# Altium footprint library AMA4B_adapter_board.PcbLib: 73 footprints (part 2 of 5)
Each footprint in its own frame and in the unit in brackets; x right, y up, seen from the top. Pads: shape width x height; smd on the part's side, far side on the other; paste and mask are expansions set on the pad; w line width, h text height; cw(c..) or ccw(c..) is an arc to the next point about the centre after c.
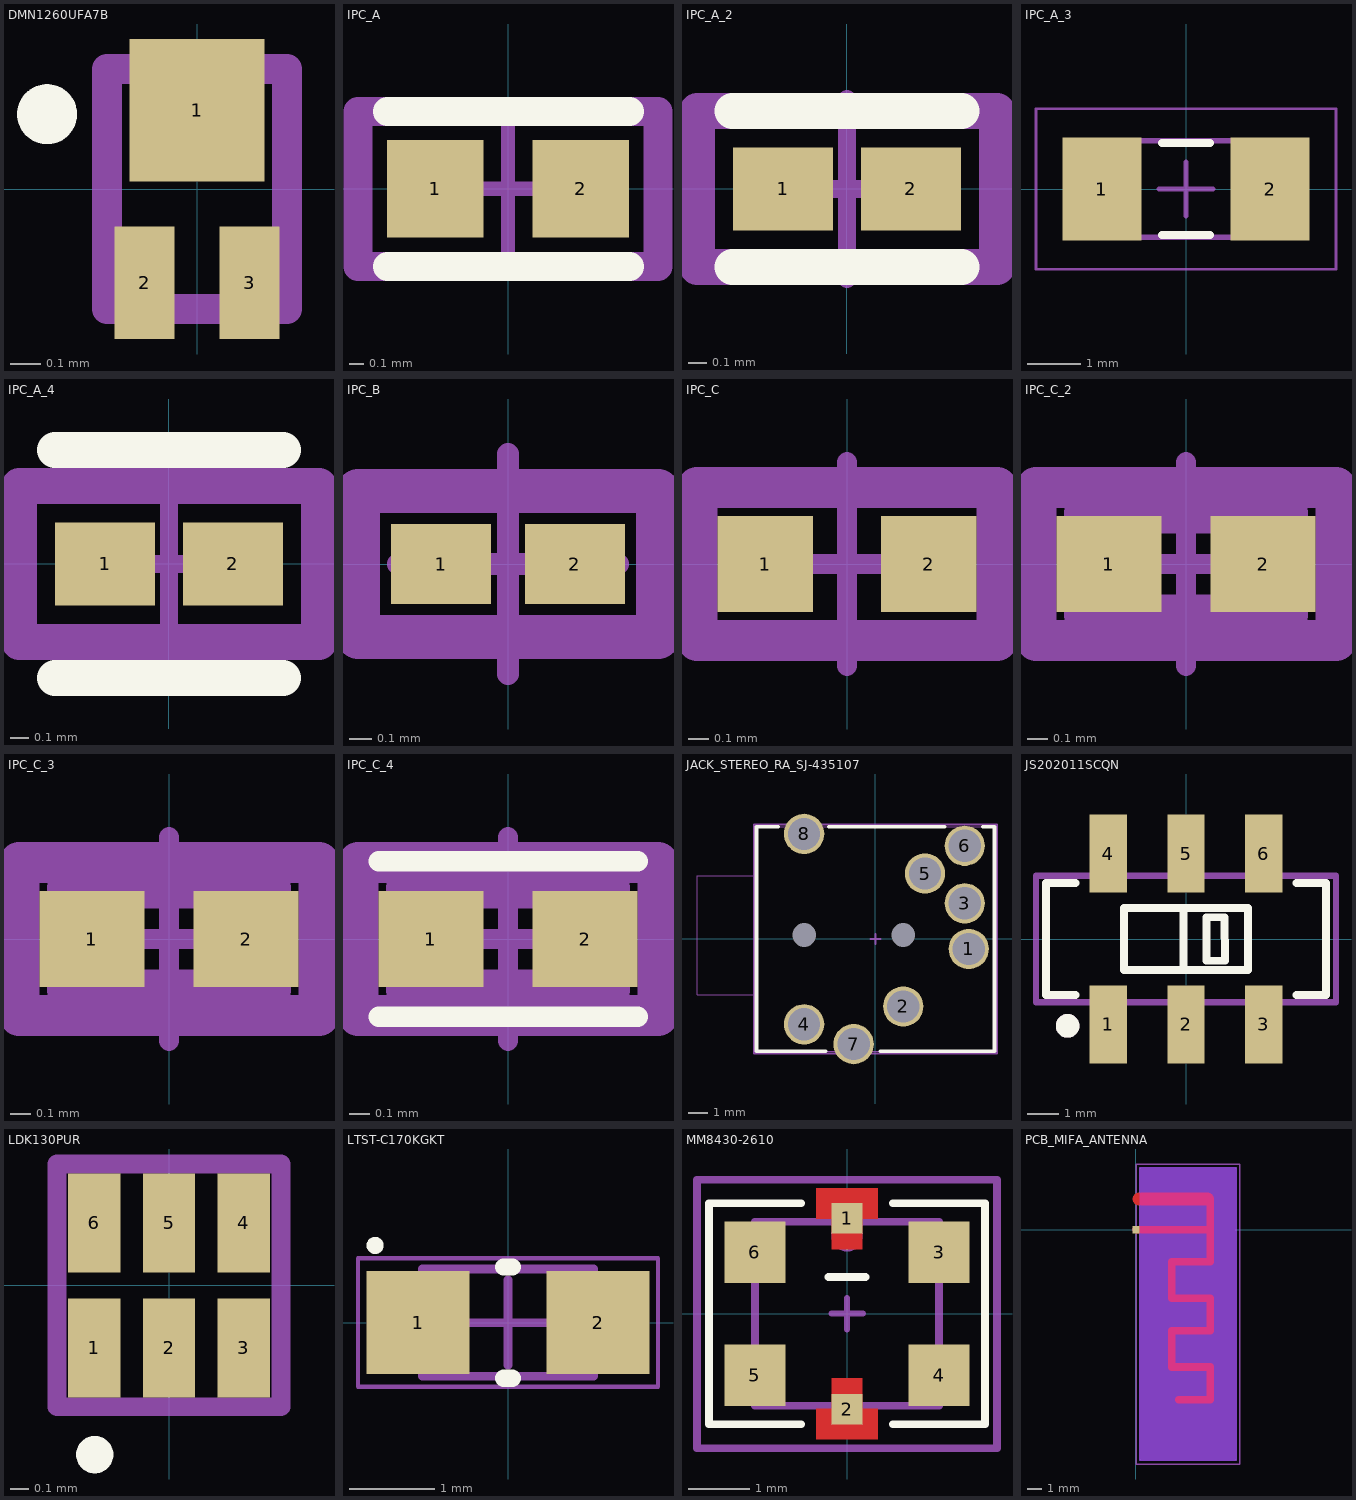
[diagram p1: the footprints below, top view; thin cyan lines are the x and y axes]

## DMN1260UFA7B [mm]
pads (3):
  rect 0.45x0.475 smd: 1(0,0.263)
  rect 0.2x0.375 smd: 2(-0.175,-0.312) 3(0.175,-0.312)
Top Overlay:
  lines w0.1: -0.5,0.2 ccw(c-0.5,0.25) -0.5,0.3 ccw(c-0.5,0.25) -0.5,0.2
Top Assembly:
  lines w0.1: -0.3,-0.4 0.3,-0.4 0.3,0.4 -0.3,0.4 -0.3,-0.4
  text ".Designator" at -0.674,-0.068 h0.3
3D body "DMN1260UFA-7B.stp": height 0.35, standoff -0.01, extent -0.325,-0.431 0.325,0.425

## IPC_A [mm]
pads (2):
  rect 0.668x0.672 smd mask+0.051: 1(-0.502,0) 2(0.502,0)
Top Overlay:
  lines w0.2: -0.834,-0.537 0.839,-0.537 ; -0.834,0.536 0.839,0.536
Top Assembly:
  lines w0.2: -1.036,-0.536 1.036,-0.536 1.036,0.536 -1.036,0.536 -1.036,-0.536
  text ".Designator" at -1.126,-0.113 h0.5
Top Courtyard:
  lines w0.2: -1.036,-0.536 1.036,-0.536 1.036,0.536 -1.036,0.536 -1.036,-0.536
Top Component Center:
  lines w0.1: -0.5,0 0.5,0 ; 0,-0.5 0,0.5
3D body: height 0.4, standoff 0, extent 0.275,-0.275 0.525,0.275
3D body: height 0.4, standoff 0, extent -0.525,-0.275 -0.275,0.275
3D body: height 0.4, standoff 0, extent -0.275,-0.275 0.275,0.275

## IPC_A_2 [mm]
pads (2):
  rect 0.554x0.463 smd mask+0.025: 1(-0.354,0) 2(0.354,0)
Top Overlay:
  lines w0.2: -0.635,-0.432 0.635,-0.432 ; -0.635,0.432 0.635,0.432
Board Shape:
  lines w0.2: -0.831,-0.431 -0.831,0.431 0.831,0.431 0.831,-0.431 -0.831,-0.431
  text ".Designator" at 2.152,-0.874 h1
Top Courtyard:
  lines w0.2: -0.831,-0.431 -0.831,0.431 0.831,0.431 0.831,-0.431 -0.831,-0.431
Top Component Center:
  lines w0.1: -0.5,0 0.5,0 ; 0,-0.5 0,0.5
3D body: height 0.33, standoff 0, extent -0.165,-0.165 0.165,0.165
3D body: height 0.33, standoff 0, extent -0.315,-0.165 -0.165,0.165
3D body: height 0.33, standoff 0, extent 0.165,-0.165 0.315,0.165

## IPC_A_3 [mm]
pads (2):
  rect 1.47x1.92 smd: 1(-1.57,0) 2(1.57,0)
Top Overlay:
  lines w0.152: -0.45,-0.86 0.45,-0.86 ; -0.45,0.86 0.45,0.86
Board Shape:
  lines w0.1: -1.75,-0.9 1.75,-0.9 1.75,0.9 -1.75,0.9 -1.75,-0.9
  text ".Designator" at -1.145,-0.115 h0.51
Top Courtyard:
  lines w0.05: -2.8,-1.5 2.8,-1.5 2.8,1.5 -2.8,1.5 -2.8,-1.5
Top Component Center:
  lines w0.1: -0.5,0 0.5,0 ; 0,-0.5 0,0.5
3D body "INDC3216X11M.step": height 1.1, standoff 0, extent -1.75,-0.9 1.75,0.9

## IPC_A_4 [mm]
pads (2):
  rect 0.554x0.463 smd mask+0.025: 1(-0.354,0) 2(0.354,0)
Top Overlay:
  lines w0.2: -0.631,-0.631 0.631,-0.631 ; -0.631,0.631 0.631,0.631
Board Shape:
  lines w0.2: -0.831,-0.431 0.831,-0.431 0.831,0.431 -0.831,0.431 -0.831,-0.431
  text ".Designator" at -0.713,0.975 h1
Top Courtyard:
  lines w0.2: -0.831,-0.431 0.831,-0.431 0.831,0.431 -0.831,0.431 -0.831,-0.431
Top Component Center:
  lines w0.1: -0.5,0 0.5,0 ; 0,-0.5 0,0.5
3D body: height 0.33, standoff 0, extent 0.165,-0.165 0.315,0.165
3D body: height 0.33, standoff 0, extent -0.315,-0.165 -0.165,0.165
3D body: height 0.33, standoff 0, extent -0.165,-0.165 0.165,0.165

## IPC_B [mm]
pads (2):
  rect 0.454x0.363 smd mask+0.025: 1(-0.304,0) 2(0.304,0)
Board Shape:
  lines w0.2: -0.681,-0.331 -0.681,0.331 0.681,0.331 0.681,-0.331 -0.681,-0.331
  text ".Designator" at 2.015,-0.698 h1
Top Courtyard:
  lines w0.2: -0.681,-0.331 -0.681,0.331 0.681,0.331 0.681,-0.331 -0.681,-0.331
Top Component Center:
  lines w0.1: -0.5,0 0.5,0 ; 0,-0.5 0,0.5
3D body: height 0.33, standoff 0, extent -0.165,-0.165 0.165,0.165
3D body: height 0.33, standoff 0, extent -0.315,-0.165 -0.165,0.165
3D body: height 0.33, standoff 0, extent 0.165,-0.165 0.315,0.165

## IPC_C [mm]
pads (2):
  rect 0.468x0.472 smd mask+0.051: 1(-0.402,0) 2(0.402,0)
Board Shape:
  lines w0.2: -0.736,-0.375 -0.736,0.375 0.736,0.375 0.736,-0.375 -0.736,-0.375
  text ".Designator" at -0.686,-1.159 h1
Top Courtyard:
  lines w0.2: -0.736,-0.375 -0.736,0.375 0.736,0.375 0.736,-0.375 -0.736,-0.375
Top Component Center:
  lines w0.1: -0.5,0 0.5,0 ; 0,-0.5 0,0.5
3D body: height 0.4, standoff 0, extent -0.275,-0.275 0.275,0.275
3D body: height 0.4, standoff 0, extent -0.525,-0.275 -0.275,0.275
3D body: height 0.4, standoff 0, extent 0.275,-0.275 0.525,0.275

## IPC_C_2 [mm]
pads (2):
  rect 0.515x0.472 smd mask+0.051: 1(-0.379,0) 2(0.379,0)
Board Shape:
  lines w0.2: -0.736,-0.375 -0.736,0.375 0.736,0.375 0.736,-0.375 -0.736,-0.375
  text ".Designator" at -2.227,-1.293 h1
Top 3D Body:
  lines w0.2: -0.5,-0.25 -0.5,0.25 0.5,0.25 0.5,-0.25 -0.5,-0.25
Top Courtyard:
  lines w0.2: -0.736,-0.375 -0.736,0.375 0.736,0.375 0.736,-0.375 -0.736,-0.375
Top Component Center:
  lines w0.1: -0.5,0 0.5,0 -0.5,0 ; 0,-0.5 0,0.5 0,-0.5
3D body "Cap_Samsung_CL05A105MP5NNNC_eec.STEP": height 0.55, standoff 0, extent -0.5,-0.25 0.5,0.25

## IPC_C_3 [mm]
pads (2):
  rect 0.515x0.472 smd mask+0.051: 1(-0.379,0) 2(0.379,0)
Board Shape:
  lines w0.2: -0.736,-0.375 0.736,-0.375 0.736,0.375 -0.736,0.375 -0.736,-0.375
  text ".Designator" at -0.558,-0.253 h1
Top 3D Body:
  lines w0.2: -0.5,-0.25 0.5,-0.25 0.5,0.25 -0.5,0.25 -0.5,-0.25
Top Courtyard:
  lines w0.2: -0.736,-0.375 0.736,-0.375 0.736,0.375 -0.736,0.375 -0.736,-0.375
Top Component Center:
  lines w0.1: -0.5,0 0.5,0 -0.5,0 ; 0,-0.5 0,0.5 0,-0.5
3D body "Cap_Samsung_CL05A105MP5NNNC_eec.STEP": height 0.55, standoff 0, extent -0.5,-0.25 0.5,0.25

## IPC_C_4 [mm]
pads (2):
  rect 0.515x0.472 smd paste+0 mask+0.05: 1(-0.379,0) 2(0.379,0)
Top Overlay:
  lines w0.102: -0.635,-0.381 0.637,-0.381 ; -0.635,0.381 0.637,0.381
Board Shape:
  lines w0.2: -0.736,-0.375 -0.736,0.375 0.736,0.375 0.736,-0.375 -0.736,-0.375
  text ".Designator" at 2.176,1.217 h1
Top 3D Body:
  lines w0.2: -0.5,-0.25 -0.5,0.25 0.5,0.25 0.5,-0.25 -0.5,-0.25
Top Courtyard:
  lines w0.2: -0.736,-0.375 -0.736,0.375 0.736,0.375 0.736,-0.375 -0.736,-0.375
Top Component Center:
  lines w0.1: -0.5,0 0.5,0 ; 0,-0.5 0,0.5
3D body "Ind_Murata_LQG15HN39NJ02D_eec.STEP": height 0.25, standoff 0, extent -0.736,-0.375 0.736,0.375

## JACK_STEREO_RA_SJ-435107 [mil] "JACK_STEREO_RA_SJ-435107"
pads (10):
  round 80 hole 64: 1(185.1,-19.75) 2(55.1,-133.85) 3(177.2,70.85) 4(-141.7,-169.35) 5(98.4,129.85) 6(177.2,185.05) 7(-43.3,-208.65) 8(-141.7,208.65)
  round 10 hole 47 unplated: ""(-141.7,7.85) ""(55.1,7.85)
Top Overlay:
  lines w1: -236.2,-222.45 -236.2,222.45 ; 236.2,-222.45 236.2,222.45
  lines w7.1: -192.9,222.45 -236.2,222.45 -236.2,-222.45 -98.4,-222.45 ; -92.5,222.45 137.8,222.45 ; 9.9,-222.45 236.2,-222.45 236.2,222.45 212.6,222.45
Board Shape:
  lines w1: -236.2,-110.25 -354.3,-110.25 -354.3,125.95 -236.2,125.95 ; -236.2,-222.45 -236.2,222.45 236.2,222.45 236.2,-222.45 -236.2,-222.45
  text ".Designator" at -14.81,-81.28 h40
Top Courtyard:
  lines w4: -241.2,-227.45 -241.2,227.45 241.2,227.45 241.2,-227.45 -241.2,-227.45
Top Component Center:
  lines w4: -10,0 10,0 ; 0,-10 0,10
3D body: height 250, standoff 0, extent -236.2,-222.45 236.2,222.45
3D body: height 248, standoff 12, extent -354.3,-110.15 -236.3,125.85

## JS202011SCQN [mm]
pads (6):
  rect 1.2x2.5 smd: 1(-2.5,-2.75) 2(0,-2.75) 3(2.5,-2.75) 4(-2.5,2.75) 5(0,2.75) 6(2.5,2.75)
Top Overlay:
  circle w0.508: c-3.81,-2.794 r0.127
  lines w0.254: -3.556,-1.8 -4.5,-1.8 -4.5,1.8 -3.556,1.8 ; -0.08,-1 -0.08,1 ; 3.556,-1.8 4.5,-1.8 4.5,1.8 3.556,1.8 ; -2,-1 -2,1 2,1 2,-1 -2,-1 ; 0.66,-0.7 0.66,0.7 1.24,0.7 1.26,-0.7 0.66,-0.7
Board Shape:
  circle w0.508: c-3.81,-2.794 r0.127
  lines w0.203: -0.08,-1 -0.08,1 ; -4.826,-2.032 -4.826,2.032 4.826,2.032 4.826,-2.032 -4.826,-2.032 ; -2,-1 2,-1 2,1 -2,1 -2,-1 ; 0.66,-0.7 0.66,0.7 1.24,0.7 1.26,-0.7 0.66,-0.7
  text ".Designator" at -3.008,-3.409 h1.52
3D body "JS.stp": height 3.6, standoff 0, extent -4.6,-3.5 4.6,3.5

## LDK130PUR [mm]
pads (6):
  rect 0.28x0.53 smd: 1(-0.4,-0.335) 2(0,-0.335) 3(0.4,-0.335) 4(0.4,0.335) 5(0,0.335) 6(-0.4,0.335)
Top Overlay:
  lines w0.1: -0.397,-0.957 ccw(c-0.397,-0.907) -0.397,-0.857 ccw(c-0.397,-0.907) -0.397,-0.957
Top 3D Body:
  lines w0.1: -0.6,-0.65 -0.6,0.65 0.6,0.65 0.6,-0.65 -0.6,-0.65
3D body "LDK130PU-R.stp": height 0.51, standoff 0, extent -0.648,-0.597 0.648,0.597

## LTST-C170KGKT [mm] "SMD, 2-Leads, Body 2.00x1.25mm"
height 1.1
pads (2):
  rect 1.2x1.2 smd: 1(-1.05,0) 2(1.05,0)
Top Overlay:
  circle w0.1: c-1.55,0.9 r0.05
  lines w0.2: -0.05,-0.65 0.05,-0.65 ; -0.05,0.65 0.05,0.65
Board Shape:
  rectangle: -1,-0.625 -0.731,0.625
  lines w0.1: -1,-0.625 -1,0.625 1,0.625 1,-0.625 -1,-0.625
  text ".Designator" at 2.289,0.23 h1.02
Top Courtyard:
  lines w0.05: -1.75,-0.75 1.75,-0.75 1.75,0.75 -1.75,0.75 -1.75,-0.75
Top Component Center:
  lines w0.1: -0.5,0 0.5,0 ; 0,-0.5 0,0.5
3D body: height 1.1, standoff 0.5, extent -0.7,-0.625 0.7,0.625
3D body: height 0.5, standoff 0, extent -1,-0.625 1,0.625

## MM8430-2610 [mm] "MM8430-2610"
pads (6):
  rect 0.498x0.498 smd paste+0 mask+0.102: 1(0,1.557)
  rect 0.5x0.5 smd mask+0.102: 2(0,-1.557)
  rect 1.001x1.001 smd mask+0.05: 3(1.501,1.001) 4(1.501,-1.001) 5(-1.501,-1.001) 6(-1.501,1.001)
Top Layer:
  region: 0.249,-1.049 0.249,-1.549 0.5,-1.549 0.5,-2.05 -0.5,-2.05 -0.5,-1.549 -0.249,-1.549 -0.249,-1.049
  region: 0.249,-1.049 0.249,-1.549 0.5,-1.549 0.5,-2.05 -0.5,-2.05 -0.5,-1.549 -0.249,-1.549 -0.249,-1.049
  region: -0.249,1.049 -0.249,1.549 -0.5,1.549 -0.5,2.05 0.5,2.05 0.5,1.549 0.249,1.549 0.249,1.049
Top Overlay:
  lines w0.127: -0.749,-1.801 -2.25,-1.801 -2.25,1.801 -0.749,1.801 ; -0.3,0.6 0.3,0.6 ; 0.749,-1.801 2.25,-1.801 2.25,1.801 0.749,1.801
Top Paste:
  region: -0.249,1.049 -0.249,1.549 -0.5,1.549 -0.5,2.05 0.5,2.05 0.5,1.549 0.249,1.549 0.249,1.049
  region: -0.249,1.049 -0.249,1.549 -0.5,1.549 -0.5,2.05 0.5,2.05 0.5,1.549 0.249,1.549 0.249,1.049
  region: 0.249,-1.049 0.249,-1.549 0.5,-1.549 0.5,-2.05 -0.5,-2.05 -0.5,-1.549 -0.249,-1.549 -0.249,-1.049
  region: 0.249,-1.049 0.249,-1.549 0.5,-1.549 0.5,-2.05 -0.5,-2.05 -0.5,-1.549 -0.249,-1.549 -0.249,-1.049
Top Solder:
  region: 0.3,-0.998 0.3,-1.499 0.551,-1.499 0.551,-2.098 -0.551,-2.098 -0.551,-1.499 -0.3,-1.499 -0.3,-0.998
  region: -0.3,0.998 -0.3,1.499 -0.551,1.499 -0.551,2.098 0.551,2.098 0.551,1.499 0.3,1.499 0.3,0.998
Board Shape:
  circle w0.254: c0,1.27 r0.127
  lines w0.127: -1.501,-1.501 -1.501,1.501 1.501,1.501 1.501,-1.501 -1.501,-1.501
  text ".Designator" at -0.165,2.366 h1.02
Top Courtyard:
  lines w0.127: -2.446,-2.194 -2.446,2.186 2.446,2.186 2.446,-2.194 -2.446,-2.194
Top Component Center:
  lines w0.102: -0.252,0.004 0.256,0.004 ; 0,-0.254 0,0.254
3D body "User Library-MM8430-2610.STEP": height 1.75, standoff 0, extent -1.5,-1.496 1.5,1.504

## PCB_MIFA_ANTENNA [mil] "PCB_MIFA_ANTENNA"
pads (1):
  rect 19x20.7 smd paste+0 mask+4: 1(0,0)
Top Layer:
  lines w20.7: 0.9,0.1 200.9,0.1 ; 115.9,-458.9 200.9,-458.9 200.9,-370.9 96.9,-370.9 96.9,-272.9 200.9,-272.9 200.9,-184.9 96.9,-184.9 96.9,-86.9 200.9,-86.9 200.9,0.1 ; 200.9,83.1 200.9,0.1
  lines w36: 8.9,83.1 192.9,83.1
Top Layer keep-out:
  region: 182.89,59.13 182.89,15.91 10.9,15.91 10.9,59.13
  region: 43.9,124.91 43.9,108.04 11,108.04 11,124.91 11,167.4 268.9,167.4 268.9,-622.6 11,-622.6 11,-22.13 168.9,-22.13 168.9,-56.09 75.99,-56.09 75.99,-211.29 174.01,-211.29 174.01,-248.27 75.99,-248.27 75.99,-397.45 168.9,-397.45 168.9,-432.28 75.99,-432.28 75.99,-485.16 231.19,-485.16 231.19,-340.27 121.99,-340.27 121.99,-295.13 231.19,-295.13 231.19,-160.13 121.99,-160.13 121.99,-113.27 231.19,-113.27 231.19,124.91
Mid-Layer 1 keep-out:
  region: 11,-622.6 271,-622.6 271,167.4 11,167.4
Bottom Layer keep-out:
  region: 11,-622.6 271,-622.6 271,167.4 11,167.4
Top Overlay:
  text ".Designator" at -86.1,168.1 h40
Board Shape:
  lines w4: 11,-622.6 271,-622.6 271,167.4 11,167.4 11,-622.6
  text ".Designator" at 45,120 h40
  text "PCB Antenna" at 160.44,-100 h40
  text "No Assembly Req'd" at 102.51,-45 h40
Top Courtyard:
  lines w4: 1,-632.6 281,-632.6 281,177.4 1,177.4 1,-632.6
Top Component Center:
  lines w4: -10,0 10,0 ; 0,-10 0,10